# Altium footprint library Connector.PcbLib: 65 footprints (part 1 of 5)
Each footprint in its own frame and in the unit in brackets; x right, y up, seen from the top. Pads: shape width x height; smd on the part's side, far side on the other; paste and mask are expansions set on the pad; w line width, h text height; cw(c..) or ccw(c..) is an arc to the next point about the centre after c.
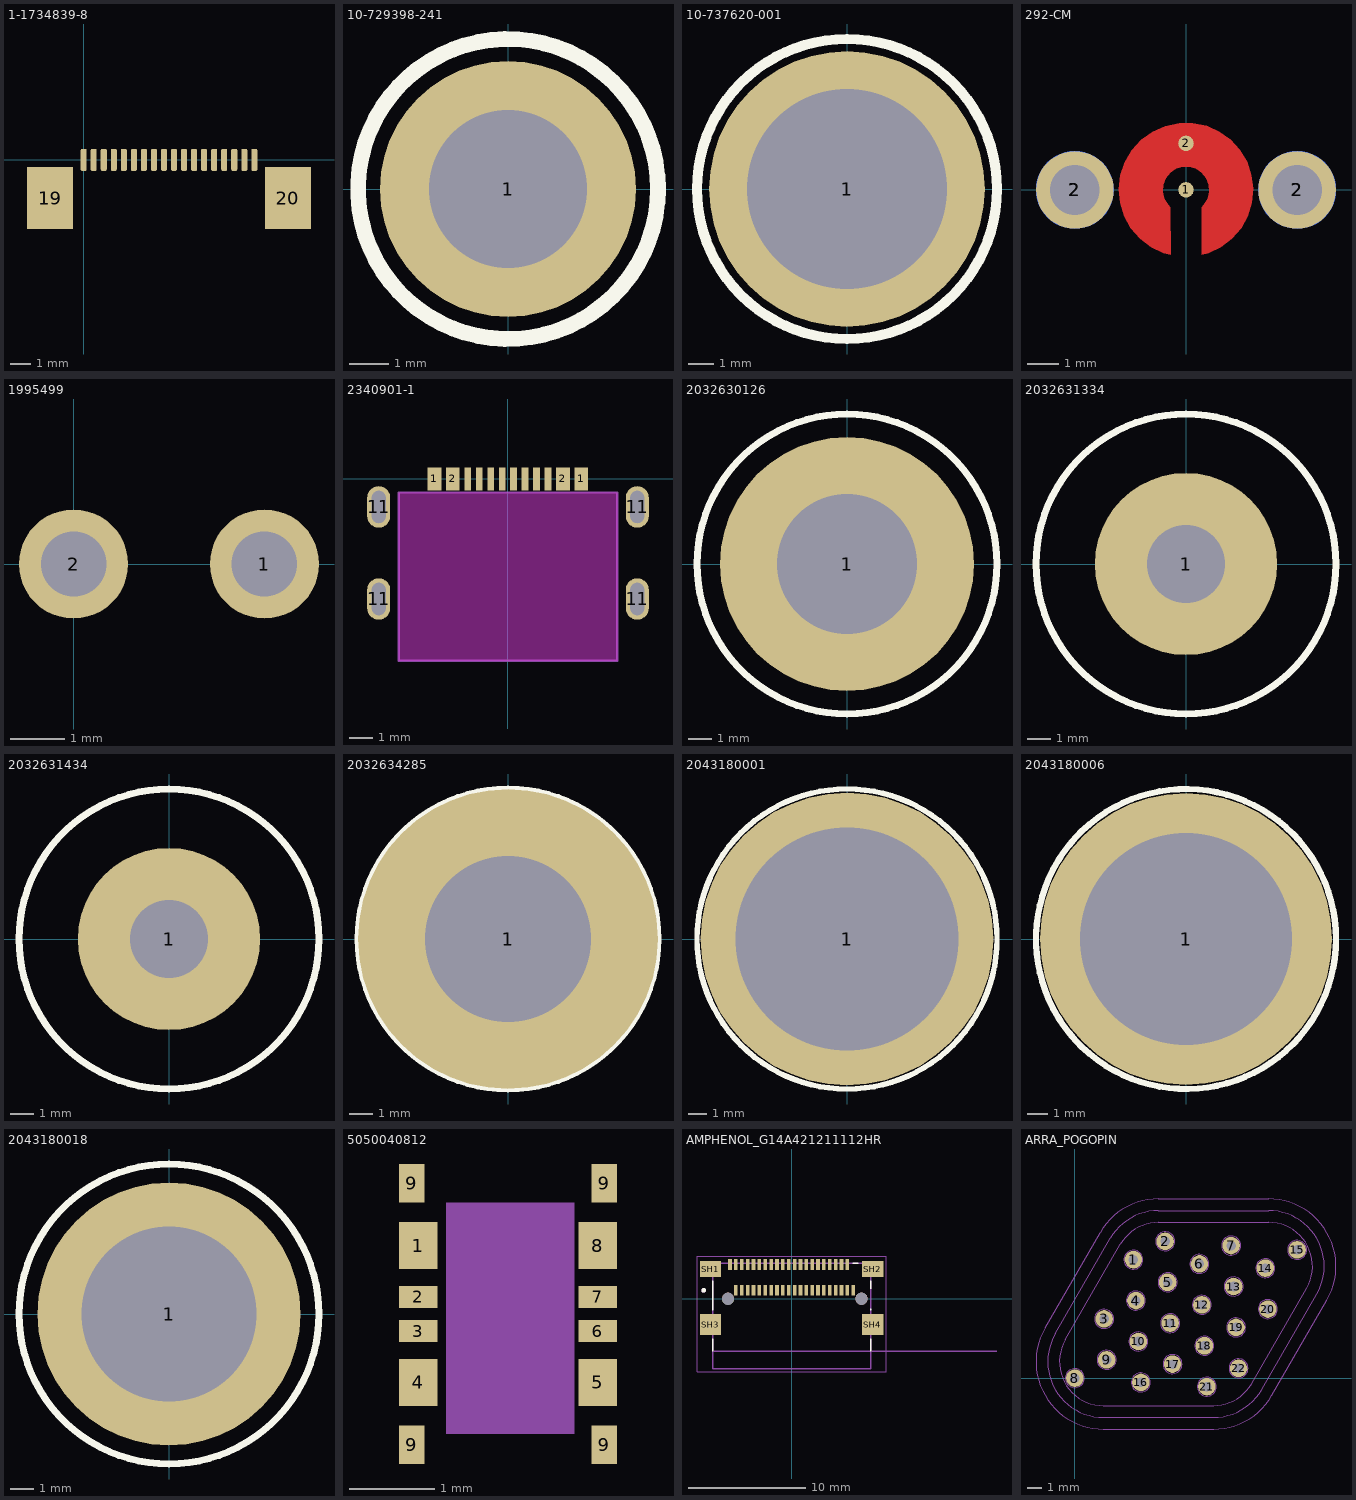
[diagram p0: the footprints below, top view; thin cyan lines are the x and y axes]

## 1-1734839-8 [mm] "FPC Connector"
pads (20):
  rrect50% 0.3x1.1 smd: 1(8.5,0) 2(8,0) 3(7.5,0) 4(7,0) 5(6.5,0) 6(6,0) 7(5.5,0) 8(5,0) 9(4.5,0) 10(4,0) 11(3.5,0) 12(3,0) 13(2.5,0) 14(2,0) 15(1.5,0) 16(1,0) 17(0.5,0) 18(0,0)
  rect 2.3x3.1 smd: 19(-1.67,-1.9) 20(10.17,-1.9)
3D body "c-1-1734839-8-c-3d.stp": height 2.2, standoff 0.15, extent -2.965,-4.86 11.465,0.25

## 10-729398-241 [mm] "Amphenol Pin connector 2.4mm pins"
pads (1):
  round 6.5 hole 4: 1(0,0)
Top Overlay:
  circle w0.4: c0,0 r3.808
Mechanical 11:
  text ".Designator" at 0,0 h1.5
3D body "10-729398-241.stp": height 2.5, standoff -5.12, extent -2.9,-2.9 2.9,2.9

## 10-737620-001 [mm] "Amphenol single connector 5.7mm pins"
pads (1):
  round 10.76 hole 7.8: 1(0,0)
Top Overlay:
  circle w0.4: c0,0 r5.858
Top Paste:
  circle w1.2: c0,0 r4.653
Mechanical 11:
  text ".Designator" at 0,0 h1.5
3D body "10-737620-001-3d-cus-e.STEP": height 6.06, standoff -7.3, extent -5.5,-5.5 5.5,5.5

## 292-CM [mm] "50 Ohm SMA 2.92 Jack, Compression Mount"
pads (8):
  round 0.5 smd paste-1 mask+0.102: 1(0,0) 2(0,1.5)
  round 2.5 smd paste-1 mask+0.102: 2(-3.58,0) 2(3.58,0)
  round 1.524 hole 1.6 mask+0.102: 2(-3.58,0) 2(3.58,0)
  round 2.5 smd far side paste-1 mask+0.102: 2(-3.58,0)
  round 2.5 smd far side paste-1 mask+0: 2(3.58,0)
Top Layer:
  region: -0.498,-2.092 -0.716,-2.04 -1.121,-1.848 -1.478,-1.577 -1.772,-1.239 -1.989,-0.847 -2.121,-0.419 -2.161,0.028 -2.109,0.473 -1.967,0.897 -1.739,1.284 -1.437,1.615 -1.073,1.876 -0.664,2.057 -0.225,2.15 0.223,2.15 0.662,2.058 1.072,1.877 1.436,1.616 1.738,1.285 1.966,0.899 2.109,0.475 2.161,0.03 2.121,-0.417 1.99,-0.845 1.773,-1.237 1.48,-1.576 1.123,-1.847 0.718,-2.039 0.5,-2.091 0.5,-0.559 0.578,-0.478 0.694,-0.284 0.747,-0.065 0.733,0.159 0.652,0.37 0.513,0.547 0.328,0.675 0.113,0.741 -0.113,0.741 -0.328,0.675 -0.513,0.547 -0.652,0.37 -0.733,0.159 -0.747,-0.065 -0.694,-0.284 -0.578,-0.478 -0.5,-0.559
3D body "292-J-P-XX-ST-CM2.step": height 11.51, standoff -0.05, extent -4.955,-3.163 4.955,3.164

## 1995499 [mm] "Terminal block 2 pin"
pads (2):
  round 2 hole 1.2: 1(3.5,0) 2(0,0)
Mechanical 11:
  text ".Designator" at 2,-3 h1.5
3D body "1995499.stp": height 7.25, standoff -3.4, extent -2.425,-8.026 5.975,1.174
3D body "pxc_1952267_06_FMC-1-5-2-ST-3-5_3D.stp": height 8.29, standoff 0.54, extent -2.25,-31.7 5.5,-8.8

## 2340901-1 [mm] "Te Flush mounted USB-C"
pads (16):
  rect 0.6x1 smd: 1(-3.2,0) 1(3.187,-0.005) 2(-2.4,0) 2(2.387,-0.005)
  rect 0.3x1 smd: 3(-1.75,0) 4(-1.25,0) 5(-0.75,0) 6(-0.25,0) 7(0.237,-0.005) 8(0.737,-0.005) 9(1.237,-0.005) 10(1.737,-0.005)
  oval 1x1.8 hole 1.4 slot 0.6 at 0 deg: 11(-5.62,-5.22) 11(-5.62,-1.22) 11(5.62,-5.22) 11(5.62,-1.22)
Keep-Out Layer:
  board cut-out: -4.75,-7.9 -4.75,-0.595 4.75,-0.595 4.75,-7.9
Mechanical 1:
  lines w0.1: -4.75,-7.9 4.75,-7.9 4.75,-0.595 -4.75,-0.595 -4.75,-7.9
3D body "c-2340901-1-1-3d.stp": height 1.58, standoff -1.58, extent -5.77,-7.4 5.77,0.15

## 2032630126 [mm] "Molex 6mm mating pin 14mm"
pads (1):
  round 11 hole 6.05 paste-2539.97: 1(0,0)
Top Overlay:
  circle w0.3: c0,0 r6.5
Top Paste:
  region: -5.113,0.573 -3.117,0.573 -3.065,0.807 -2.909,1.262 -2.686,1.687 -2.401,2.074 -2.062,2.414 -1.675,2.698 -1.25,2.921 -0.795,3.077 -0.561,3.129 -0.561,5.125 -0.849,5.093 -1.415,4.965 -1.963,4.774 -2.485,4.523 -2.977,4.215 -3.43,3.853 -3.841,3.443 -4.202,2.989 -4.511,2.498 -4.762,1.975 -4.953,1.427 -5.081,0.862 -5.113,0.573
  region: -0.561,-5.113 -0.561,-3.117 -0.795,-3.065 -1.25,-2.909 -1.675,-2.686 -2.062,-2.401 -2.401,-2.062 -2.686,-1.675 -2.909,-1.25 -3.065,-0.795 -3.117,-0.561 -5.113,-0.561 -5.081,-0.849 -4.953,-1.415 -4.762,-1.963 -4.511,-2.485 -4.202,-2.977 -3.841,-3.43 -3.431,-3.841 -2.977,-4.202 -2.486,-4.511 -1.963,-4.762 -1.415,-4.953 -0.849,-5.081 -0.561,-5.113
  region: 5.125,-0.561 3.129,-0.561 3.077,-0.795 2.921,-1.25 2.698,-1.675 2.414,-2.062 2.074,-2.401 1.687,-2.686 1.262,-2.909 0.807,-3.065 0.573,-3.117 0.573,-5.113 0.861,-5.081 1.427,-4.953 1.975,-4.762 2.498,-4.511 2.989,-4.202 3.443,-3.841 3.853,-3.431 4.214,-2.977 4.523,-2.486 4.774,-1.963 4.965,-1.415 5.093,-0.849 5.125,-0.561
  region: 0.573,5.125 0.573,3.129 0.807,3.077 1.262,2.921 1.687,2.698 2.074,2.414 2.414,2.074 2.698,1.687 2.921,1.262 3.077,0.807 3.129,0.573 5.125,0.573 5.093,0.861 4.965,1.427 4.774,1.975 4.523,2.498 4.215,2.989 3.853,3.443 3.443,3.853 2.989,4.214 2.498,4.523 1.975,4.774 1.427,4.965 0.862,5.093 0.573,5.125
Mechanical 11:
  text ".Designator" at 0,0 h1.5
3D body "2032630126.stp": height 14.03, standoff -3.22, extent -5.25,-5.25 5.25,5.25

## 2032631334 [mm] "Molex 3.4mm mating pin 14mm"
pads (1):
  round 7.9 hole 3.4 paste-2539.97: 1(0,0)
Top Overlay:
  circle w0.3: c0,0 r6.5
Top Paste:
  region: -3.613,0.4 -2.204,0.4 -2.167,0.566 -2.057,0.886 -1.9,1.186 -1.699,1.46 -1.46,1.699 -1.186,1.9 -0.886,2.057 -0.566,2.167 -0.4,2.204 -0.4,3.613 -0.603,3.59 -1.003,3.5 -1.389,3.365 -1.758,3.188 -2.105,2.97 -2.425,2.715 -2.715,2.426 -2.97,2.106 -3.188,1.759 -3.365,1.39 -3.5,1.003 -3.59,0.604 -3.613,0.4
  region: -0.4,-3.613 -0.4,-2.204 -0.566,-2.167 -0.886,-2.057 -1.186,-1.9 -1.46,-1.699 -1.699,-1.46 -1.9,-1.186 -2.057,-0.886 -2.167,-0.566 -2.204,-0.4 -3.613,-0.4 -3.59,-0.603 -3.5,-1.003 -3.365,-1.389 -3.188,-1.758 -2.97,-2.105 -2.715,-2.425 -2.426,-2.715 -2.106,-2.97 -1.759,-3.188 -1.39,-3.365 -1.003,-3.5 -0.604,-3.59 -0.4,-3.613
  region: 3.613,-0.4 2.204,-0.4 2.167,-0.566 2.057,-0.886 1.9,-1.186 1.699,-1.46 1.46,-1.699 1.186,-1.9 0.886,-2.057 0.566,-2.167 0.4,-2.204 0.4,-3.613 0.603,-3.59 1.003,-3.5 1.389,-3.365 1.758,-3.188 2.105,-2.97 2.425,-2.715 2.715,-2.426 2.97,-2.106 3.188,-1.759 3.365,-1.39 3.5,-1.003 3.59,-0.604 3.613,-0.4
  region: 0.4,3.613 0.4,2.204 0.566,2.167 0.886,2.057 1.186,1.9 1.46,1.699 1.699,1.46 1.9,1.186 2.057,0.886 2.167,0.566 2.204,0.4 3.613,0.4 3.59,0.603 3.5,1.003 3.365,1.389 3.188,1.758 2.97,2.105 2.715,2.425 2.426,2.715 2.106,2.97 1.759,3.188 1.39,3.365 1.003,3.5 0.604,3.59 0.4,3.613
Mechanical 11:
  text ".Designator" at 0,0 h1.5
3D body "2032631334.stp": height 14.03, standoff -3.22, extent -3.95,-3.95 3.95,3.95

## 2032631434 [mm] "Molex 3.4mm mating pin 12mm"
pads (1):
  round 7.9 hole 3.4 paste-2539.97: 1(0,0)
Top Overlay:
  circle w0.3: c0,0 r6.5
Top Paste:
  region: 0.4,3.613 0.4,2.204 0.566,2.167 0.886,2.057 1.186,1.9 1.46,1.699 1.699,1.46 1.9,1.186 2.057,0.886 2.167,0.566 2.204,0.4 3.613,0.4 3.59,0.603 3.5,1.003 3.365,1.389 3.188,1.758 2.97,2.105 2.715,2.425 2.426,2.715 2.106,2.97 1.759,3.188 1.39,3.365 1.003,3.5 0.604,3.59 0.4,3.613
  region: 3.613,-0.4 2.204,-0.4 2.167,-0.566 2.057,-0.886 1.9,-1.186 1.699,-1.46 1.46,-1.699 1.186,-1.9 0.886,-2.057 0.566,-2.167 0.4,-2.204 0.4,-3.613 0.603,-3.59 1.003,-3.5 1.389,-3.365 1.758,-3.188 2.105,-2.97 2.425,-2.715 2.715,-2.426 2.97,-2.106 3.188,-1.759 3.365,-1.39 3.5,-1.003 3.59,-0.604 3.613,-0.4
  region: -0.4,-3.613 -0.4,-2.204 -0.566,-2.167 -0.886,-2.057 -1.186,-1.9 -1.46,-1.699 -1.699,-1.46 -1.9,-1.186 -2.057,-0.886 -2.167,-0.566 -2.204,-0.4 -3.613,-0.4 -3.59,-0.603 -3.5,-1.003 -3.365,-1.389 -3.188,-1.758 -2.97,-2.105 -2.715,-2.425 -2.426,-2.715 -2.106,-2.97 -1.759,-3.188 -1.39,-3.365 -1.003,-3.5 -0.604,-3.59 -0.4,-3.613
  region: -3.613,0.4 -2.204,0.4 -2.167,0.566 -2.057,0.886 -1.9,1.186 -1.699,1.46 -1.46,1.699 -1.186,1.9 -0.886,2.057 -0.566,2.167 -0.4,2.204 -0.4,3.613 -0.603,3.59 -1.003,3.5 -1.389,3.365 -1.758,3.188 -2.105,2.97 -2.425,2.715 -2.715,2.426 -2.97,2.106 -3.188,1.759 -3.365,1.39 -3.5,1.003 -3.59,0.604 -3.613,0.4
Mechanical 11:
  text ".Designator" at 0,0 h1.5
3D body "2032631434.stp": height 12.03, standoff -3.22, extent -3.95,-3.95 3.95,3.95

## 2032634285 [mm] "8mm 200A pin"
pads (1):
  round 13 hole 7.2 paste-2539.97: 1(0,0)
Top Overlay:
  circle w0.3: c0,0 r6.5
Top Paste:
  region: 0.573,5.125 0.573,3.129 0.807,3.077 1.262,2.921 1.687,2.698 2.074,2.414 2.414,2.074 2.698,1.687 2.921,1.262 3.077,0.807 3.129,0.573 5.125,0.573 5.093,0.861 4.965,1.427 4.774,1.975 4.523,2.498 4.215,2.989 3.853,3.443 3.443,3.853 2.989,4.214 2.498,4.523 1.975,4.774 1.427,4.965 0.862,5.093 0.573,5.125
  region: 5.125,-0.561 3.129,-0.561 3.077,-0.795 2.921,-1.25 2.698,-1.675 2.414,-2.062 2.074,-2.401 1.687,-2.686 1.262,-2.909 0.807,-3.065 0.573,-3.117 0.573,-5.113 0.861,-5.081 1.427,-4.953 1.975,-4.762 2.498,-4.511 2.989,-4.202 3.443,-3.841 3.853,-3.431 4.214,-2.977 4.523,-2.486 4.774,-1.963 4.965,-1.415 5.093,-0.849 5.125,-0.561
  region: -0.561,-5.113 -0.561,-3.117 -0.795,-3.065 -1.25,-2.909 -1.675,-2.686 -2.062,-2.401 -2.401,-2.062 -2.686,-1.675 -2.909,-1.25 -3.065,-0.795 -3.117,-0.561 -5.113,-0.561 -5.081,-0.849 -4.953,-1.415 -4.762,-1.963 -4.511,-2.485 -4.202,-2.977 -3.841,-3.43 -3.431,-3.841 -2.977,-4.202 -2.486,-4.511 -1.963,-4.762 -1.415,-4.953 -0.849,-5.081 -0.561,-5.113
  region: -5.113,0.573 -3.117,0.573 -3.065,0.807 -2.909,1.262 -2.686,1.687 -2.401,2.074 -2.062,2.414 -1.675,2.698 -1.25,2.921 -0.795,3.077 -0.561,3.129 -0.561,5.125 -0.849,5.093 -1.415,4.965 -1.963,4.774 -2.485,4.523 -2.977,4.215 -3.43,3.853 -3.841,3.443 -4.202,2.989 -4.511,2.498 -4.762,1.975 -4.953,1.427 -5.081,0.862 -5.113,0.573
Mechanical 11:
  text ".Designator" at 0,0 h1.5
3D body "2032634285.stp": height 20.7, standoff -1.7, extent -6.375,-6.375 6.375,6.375

## 2043180001 [mm] "8mm 200A pin"
pads (1):
  round 16 hole 12.2 paste-2539.97: 1(0,0)
Top Overlay:
  circle w0.3: c0,0 r8.2
Top Paste:
  region: -1,-7.742 -1,-6.242 -1.32,-6.176 -1.948,-5.995 -2.555,-5.751 -3.133,-5.448 -3.679,-5.088 -4.185,-4.675 -4.647,-4.213 -5.06,-3.707 -5.42,-3.161 -5.724,-2.582 -5.967,-1.976 -6.148,-1.348 -6.214,-1.028 -7.714,-1.028 -7.667,-1.453 -7.478,-2.287 -7.197,-3.095 -6.826,-3.867 -6.371,-4.592 -5.838,-5.261 -5.233,-5.866 -4.564,-6.399 -3.839,-6.854 -3.068,-7.224 -2.26,-7.506 -1.425,-7.695
  region: 7.746,-0.996 6.246,-0.996 6.18,-1.316 5.999,-1.944 5.755,-2.551 5.452,-3.129 5.092,-3.675 4.679,-4.181 4.217,-4.643 3.711,-5.056 3.165,-5.416 2.586,-5.72 1.98,-5.963 1.352,-6.144 1.032,-6.21 1.032,-7.71 1.457,-7.663 2.291,-7.474 3.099,-7.193 3.871,-6.822 4.596,-6.367 5.265,-5.834 5.87,-5.229 6.403,-4.56 6.858,-3.835 7.228,-3.064 7.51,-2.256 7.699,-1.421
  region: -7.746,1.004 -6.246,1.004 -6.18,1.324 -5.999,1.952 -5.755,2.558 -5.452,3.137 -5.092,3.683 -4.679,4.189 -4.217,4.651 -3.711,5.064 -3.165,5.424 -2.586,5.728 -1.98,5.971 -1.352,6.152 -1.032,6.218 -1.032,7.718 -1.457,7.671 -2.291,7.482 -3.099,7.201 -3.871,6.83 -4.596,6.375 -5.265,5.842 -5.87,5.237 -6.403,4.568 -6.858,3.843 -7.228,3.072 -7.51,2.264 -7.699,1.429
  region: 1,7.75 1,6.25 1.32,6.184 1.948,6.003 2.555,5.759 3.133,5.456 3.679,5.096 4.185,4.683 4.647,4.221 5.06,3.715 5.42,3.169 5.724,2.59 5.967,1.984 6.148,1.356 6.214,1.036 7.714,1.036 7.667,1.461 7.478,2.295 7.197,3.103 6.826,3.875 6.371,4.599 5.838,5.269 5.233,5.874 4.564,6.407 3.839,6.862 3.068,7.232 2.26,7.514 1.425,7.703
Mechanical 11:
  text ".Designator" at 0,0 h1.5
3D body "2043180001.stp": height 4.5, standoff -5.5, extent -8,-8 8,8

## 2043180006 [mm] "6mm"
pads (1):
  round 14 hole 10.2 paste-2539.97: 1(0,0)
Top Overlay:
  circle w0.3: c0,0 r7.2
Top Paste:
  region: 1,6.75 1,5.25 1.259,5.196 1.766,5.05 2.256,4.853 2.724,4.608 3.165,4.317 3.574,3.983 3.948,3.61 4.282,3.201 4.573,2.76 4.818,2.292 5.014,1.802 5.161,1.294 5.214,1.036 6.714,1.036 6.674,1.398 6.513,2.108 6.274,2.795 5.958,3.452 5.571,4.069 5.117,4.638 4.603,5.153 4.033,5.607 3.416,5.994 2.76,6.309 2.072,6.549 1.362,6.71
  region: -6.75,1 -5.25,1 -5.196,1.259 -5.05,1.766 -4.853,2.256 -4.608,2.724 -4.317,3.165 -3.983,3.574 -3.61,3.948 -3.201,4.282 -2.76,4.573 -2.292,4.818 -1.802,5.014 -1.294,5.161 -1.036,5.214 -1.036,6.714 -1.398,6.674 -2.108,6.513 -2.795,6.274 -3.452,5.958 -4.069,5.571 -4.638,5.117 -5.153,4.603 -5.607,4.033 -5.994,3.416 -6.309,2.76 -6.549,2.072 -6.71,1.362
  region: 6.75,-1 5.25,-1 5.196,-1.259 5.05,-1.766 4.853,-2.256 4.608,-2.724 4.317,-3.165 3.983,-3.574 3.61,-3.948 3.201,-4.282 2.76,-4.573 2.292,-4.818 1.802,-5.014 1.294,-5.161 1.036,-5.214 1.036,-6.714 1.398,-6.674 2.108,-6.513 2.795,-6.274 3.452,-5.958 4.069,-5.571 4.638,-5.117 5.153,-4.603 5.607,-4.033 5.994,-3.416 6.309,-2.76 6.549,-2.072 6.71,-1.362
  region: -1,-6.75 -1,-5.25 -1.259,-5.196 -1.766,-5.05 -2.256,-4.853 -2.724,-4.608 -3.165,-4.317 -3.574,-3.983 -3.948,-3.61 -4.282,-3.201 -4.573,-2.76 -4.818,-2.292 -5.014,-1.802 -5.161,-1.294 -5.214,-1.036 -6.714,-1.036 -6.674,-1.398 -6.513,-2.108 -6.274,-2.795 -5.958,-3.452 -5.571,-4.069 -5.117,-4.638 -4.603,-5.153 -4.033,-5.607 -3.416,-5.994 -2.76,-6.309 -2.072,-6.549 -1.362,-6.71
Mechanical 11:
  text ".Designator" at 0,0 h1.5
3D body "2043180006.stp": height 4.6, standoff -5.4, extent -7,-7 7,7

## 2043180018 [mm]
pads (1):
  round 11.4 hole 7.6 paste-2539.97: 1(0,0)
Top Overlay:
  circle w0.3: c0,0 r6.5
Top Paste:
  region: 5.25,-1 4,-1 3.939,-1.275 3.756,-1.808 3.494,-2.308 3.161,-2.762 2.762,-3.161 2.308,-3.494 1.808,-3.756 1.275,-3.939 1,-4 1,-5.25 1.269,-5.22 1.797,-5.101 2.309,-4.922 2.797,-4.688 3.256,-4.4 3.679,-4.062 4.062,-3.679 4.4,-3.256 4.688,-2.797 4.922,-2.309 5.1,-1.797 5.22,-1.269
  region: 1,5.25 1,4 1.275,3.939 1.808,3.756 2.308,3.494 2.762,3.161 3.161,2.762 3.494,2.308 3.756,1.808 3.939,1.275 4,1 5.25,1 5.22,1.269 5.101,1.797 4.922,2.309 4.688,2.797 4.4,3.256 4.062,3.679 3.679,4.062 3.256,4.4 2.797,4.688 2.309,4.922 1.797,5.1 1.269,5.22
  region: -1,-5.25 -1,-4 -1.275,-3.939 -1.808,-3.756 -2.308,-3.494 -2.762,-3.161 -3.161,-2.762 -3.494,-2.308 -3.756,-1.808 -3.939,-1.275 -4,-1 -5.25,-1 -5.22,-1.269 -5.101,-1.797 -4.922,-2.309 -4.688,-2.797 -4.4,-3.256 -4.062,-3.679 -3.679,-4.062 -3.256,-4.4 -2.797,-4.688 -2.309,-4.922 -1.797,-5.1 -1.269,-5.22
  region: -5.25,1 -4,1 -3.939,1.275 -3.756,1.808 -3.494,2.308 -3.161,2.762 -2.762,3.161 -2.308,3.494 -1.808,3.756 -1.275,3.939 -1,4 -1,5.25 -1.269,5.22 -1.797,5.101 -2.309,4.922 -2.797,4.688 -3.256,4.4 -3.679,4.062 -4.062,3.679 -4.4,3.256 -4.688,2.797 -4.922,2.309 -5.1,1.797 -5.22,1.269
Mechanical 11:
  text ".Designator" at 0,0 h1.5
3D body "2043180018.stp": height 4.6, standoff -5.4, extent -5.7,-5.7 5.7,5.7

## 5050040812 [mm] "0.8mm height mated board to board connector"
pads (12):
  rect 0.45x0.55 smd: 1(1.08,3.067) 4(1.08,1.467) 5(3.18,1.467) 8(3.18,3.067)
  rect 0.45x0.26 smd: 2(1.08,2.467) 3(1.08,2.067) 6(3.18,2.067) 7(3.18,2.467)
  rect 0.3x0.45 smd: 9(1.005,0.737) 9(1.005,3.797) 9(3.255,0.737) 9(3.255,3.797)
Top Solder:
  pour cut-out: 1.405,3.567 2.905,3.567 2.905,0.867 1.405,0.867
Mechanical 1:
  pour cut-out: 1.405,3.567 2.905,3.567 2.905,0.867 1.405,0.867
3D body "5050040812.stp": height 0.73, standoff -0.02, extent 0.855,0.168 3.355,4.368

## AMPHENOL_G14A421211112HR [mm]
height 3.92
pads (48):
  rect 0.31x0.91 smd: A1(-4.75,0.72) A2(-4.25,0.72) A3(-3.75,0.72) A4(-3.25,0.72) A5(-2.75,0.72) A6(-2.25,0.72) A7(-1.75,0.72) A8(-1.25,0.72) A9(-0.75,0.72) A10(-0.25,0.72) A11(0.25,0.72) A12(0.75,0.72) A13(1.25,0.72) A14(1.75,0.72) A15(2.25,0.72) A16(2.75,0.72) A17(3.25,0.72) A18(3.75,0.72) A19(4.25,0.72) A20(4.75,0.72) A21(5.25,0.72) B1(-5.25,2.91) B2(-4.75,2.91) B3(-4.25,2.91) B4(-3.75,2.91) B5(-3.25,2.91) B6(-2.75,2.91) B7(-2.25,2.91) B8(-1.75,2.91) B9(-1.25,2.91) B10(-0.75,2.91) B11(-0.25,2.91) B12(0.25,2.91) B13(0.75,2.91) B14(1.25,2.91) B15(1.75,2.91) B16(2.25,2.91) B17(2.75,2.91) B18(3.25,2.91) B19(3.75,2.91) B20(4.25,2.91) B21(4.75,2.91)
  rect 1.81x1.38 smd: SH1(-6.91,2.52) SH2(6.91,2.52)
  rect 1.81x1.8 smd: SH3(-6.91,-2.2) SH4(6.91,-2.2)
  round 1.05 hole 1.05 unplated: ""(-5.42,0) ""(5.95,0)
Top Overlay:
  circle w0.2: c-7.5,0.72 r0.1
  lines w0.127: -6.725,-4.46 -6.725,-3.42 ; -6.725,-0.98 -6.725,1.51 ; 5.225,3.03 5.685,3.03 ; 6.725,-4.46 6.725,-3.42 ; 6.725,-0.975 6.725,-0.845 ; 6.725,0.845 6.725,1.51
Mechanical 13:
  circle w0.2: c-7.5,0.72 r0.1
  lines w0.127: 17.5,-4.46 -6.725,-4.46 ; -6.725,-4.46 -6.725,-5.97 6.725,-5.97 6.725,3.03 -6.725,3.03 -6.725,-4.46
  text "PCB EDGE" at 8.25,-4.2 h1.27
Mechanical 15:
  lines w0.05: -8.065,-6.22 8.065,-6.22 8.065,3.615 -8.065,3.615 -8.065,-6.22
3D body "step_temp.STEP": height 3.92, standoff -0.54, extent -7.649,-5.987 7.651,3.083

## ARRA_POGOPIN [mm] "custom connector ARRA"
pads (22):
  round 1.2 hole 0.65: 1(3.995,8.08) 2(6.16,9.33) 3(1.998,4.04) 4(4.163,5.29) 5(6.328,6.54) 6(8.493,7.79) 7(10.658,9.04) 8(0,0) 9(2.165,1.25) 10(4.33,2.5) 11(6.495,3.75) 12(8.66,5) 13(10.825,6.25) 14(12.99,7.5) 15(15.155,8.75) 16(4.498,-0.29) 17(6.663,0.96) 18(8.828,2.21) 19(10.993,3.46) 20(13.158,4.71) 21(8.995,-0.58) 22(11.16,0.67)
Mechanical 1:
  circle w0.013: c6.16,9.33 r0.65
  circle w0.013: c3.995,8.08 r0.65
  circle w0.013: c8.493,7.79 r0.65
  circle w0.013: c10.658,9.04 r0.65
  circle w0.013: c6.328,6.54 r0.65
  circle w0.013: c15.155,8.75 r0.65
  circle w0.013: c10.825,6.25 r0.65
  circle w0.013: c8.66,5 r0.65
  circle w0.013: c12.99,7.5 r0.65
  circle w0.013: c6.495,3.75 r0.65
  circle w0.013: c13.158,4.71 r0.65
  circle w0.013: c10.993,3.46 r0.65
  circle w0.013: c8.828,2.21 r0.65
  circle w0.013: c11.16,0.67 r0.65
  circle w0.013: c8.995,-0.58 r0.65
  circle w0.013: c4.163,5.29 r0.65
  circle w0.013: c6.663,0.96 r0.65
  circle w0.013: c4.33,2.5 r0.65
  circle w0.013: c1.998,4.04 r0.65
  circle w0.013: c4.498,-0.29 r0.65
  circle w0.013: c2.165,1.25 r0.65
  circle w0.013: c0,0 r0.65
  lines w0.013: -2.035,3.425 ccw(c1.949,1.125) 1.949,-3.475 9.454,-3.475 ccw(c9.454,1.125) 13.438,-1.175 17.191,5.325 ccw(c13.207,7.625) 13.207,12.225 5.701,12.225 ccw(c5.701,7.625) 1.718,9.925 -2.035,3.425 ; -1.342,3.025 ccw(c1.949,1.125) 1.949,-2.675 9.454,-2.675 ccw(c9.454,1.125) 12.745,-0.775 16.498,5.725 ccw(c13.207,7.625) 13.207,11.425 5.701,11.425 ccw(c5.701,7.625) 2.41,9.525 -1.342,3.025 ; -0.65,2.625 ccw(c1.949,1.125) 1.949,-1.875 9.454,-1.875 ccw(c9.454,1.125) 12.052,-0.375 15.805,6.125 ccw(c13.207,7.625) 13.207,10.625 5.701,10.625 ccw(c5.701,7.625) 3.103,9.125 -0.65,2.625